# Altium footprint library mobinbyn-Capacitor.PcbLib: 152 footprints (part 4 of 10)
Each footprint in its own frame and in the unit in brackets; x right, y up, seen from the top. Pads: shape width x height; smd on the part's side, far side on the other; paste and mask are expansions set on the pad; w line width, h text height; cw(c..) or ccw(c..) is an arc to the next point about the centre after c.
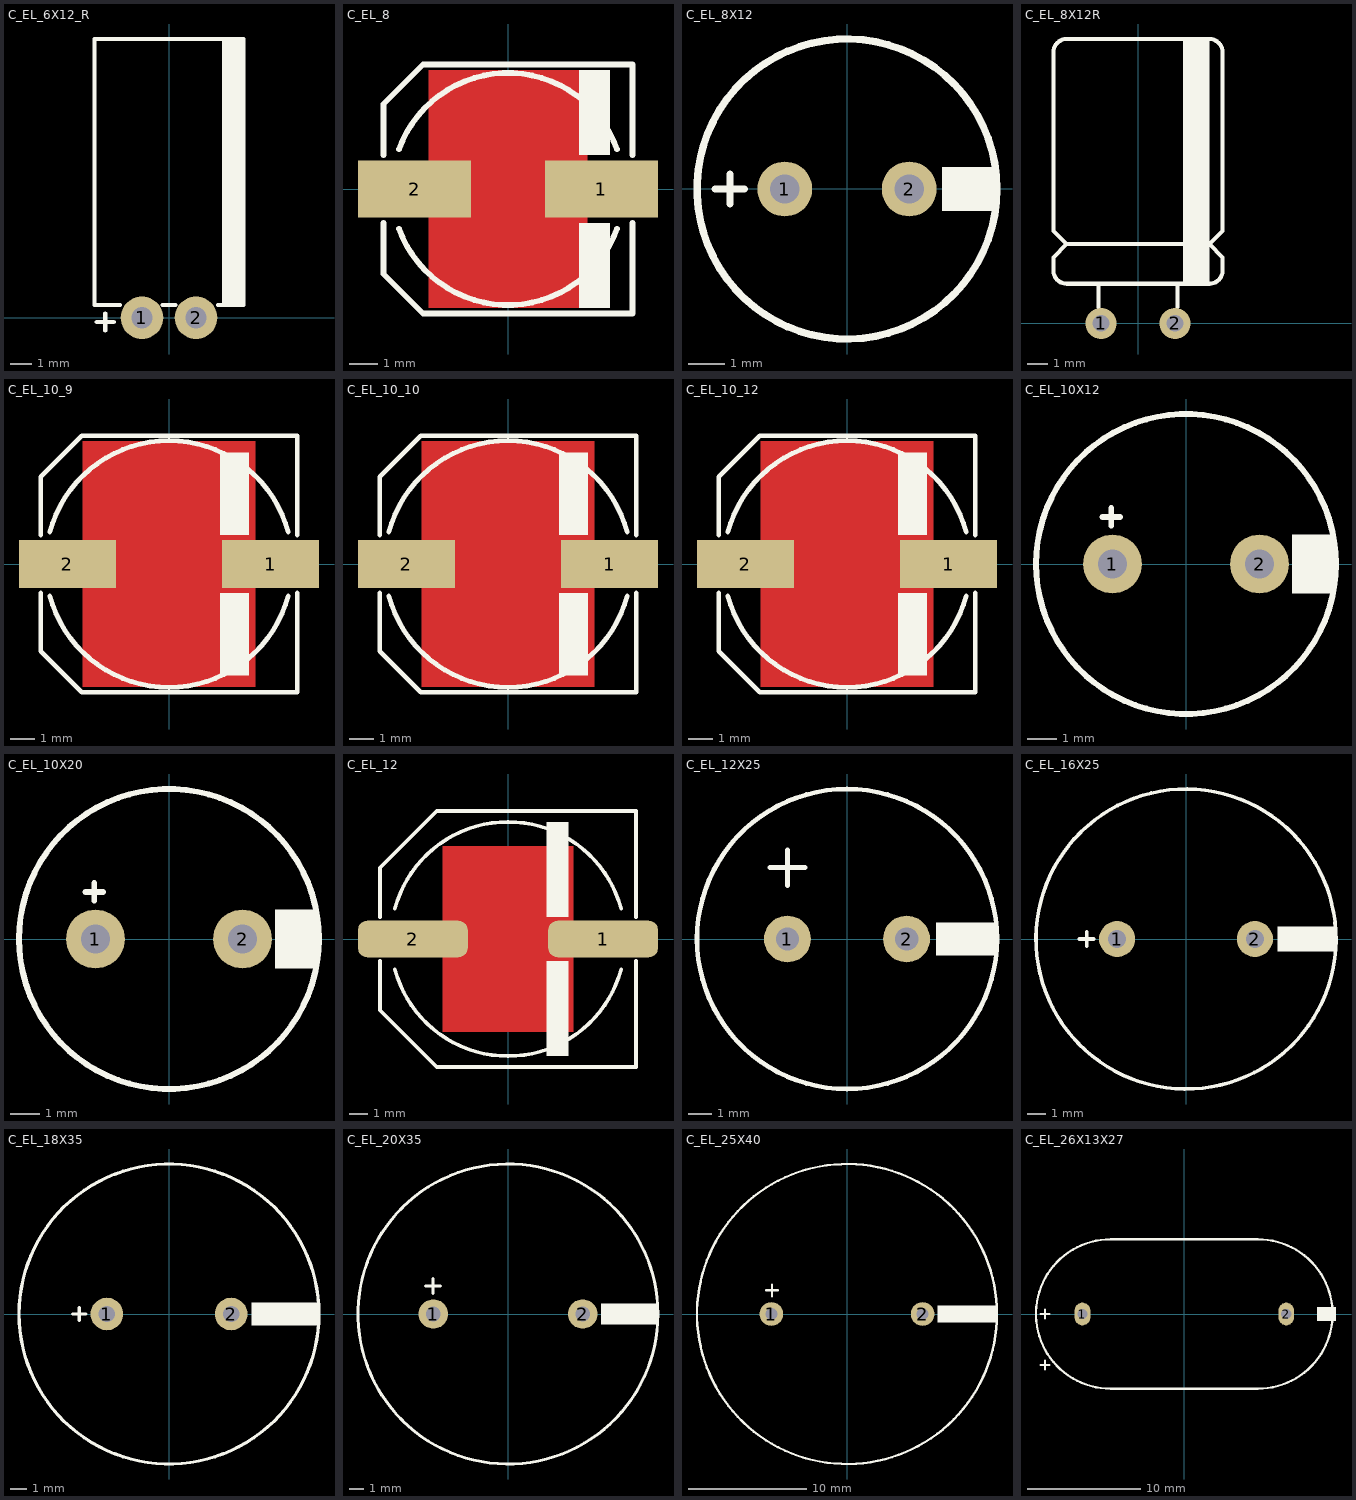
[diagram p3: the footprints below, top view; thin cyan lines are the x and y axes]

## C_EL_6X12_R [mm] "Cap Elec, D6.3X12.0H pitch: 2.5mm"
height 11
pads (2):
  round 2 hole 1: 1(-1.27,0) 2(1.27,0)
Top Overlay:
  rectangle: 2.5,0.6 3.5,13.1
  lines w0.2: -3.4,-0.2 -2.6,-0.2 ; -3,-0.6 -3,0.2 ; -2.3,0.6 -3.5,0.6 -3.5,13.1 3.5,13.1 3.5,0.6 2.3,0.6 ; -0.3,0.6 0.3,0.6
3D body "CAPAE250P680X1220_FLAT1.STEP": height 6.8, standoff -1.78, extent -3.401,-0.249 3.4,12.952

## C_EL_8 [mm] "Electrolytic Cap, Size E, Size F, 8.3X10"
height 10
pads (2):
  rect 4x2 smd: 1(3.3,0) 2(-3.3,0)
Top Layer:
  pour cut-out: 2.794,4.191 2.794,-4.191 -2.794,-4.191 -2.794,4.191
Top Overlay:
  rectangle: 2.5,1.2 3.6,4.2
  rectangle: 2.5,-4.2 3.6,-1.2
  lines w0.2: -4.4,-1.2 -4.4,-3 -3,-4.4 4.4,-4.4 4.4,-1.2 ; -4.4,1.2 -4.4,3 -3,4.4 4.4,4.4 4.4,1.2 ; -3.853,-1.402 ccw(c0,0) 3.853,-1.402 ; -3.853,1.402 cw(c0,0) 3.853,1.402
3D body "Cap_0810.STEP": height 10.3, standoff -0.2, extent -4.902,-4.25 4.798,4.25

## C_EL_8X12 [mm] "Cap Elec, D8.0X12.0H pitch: 3.5mm, RB.14/.26, RB.15/.32"
height 12
pads (2):
  round 1.5 hole 0.8: 1(-1.7,0) 2(1.7,0)
Top Overlay:
  circle w0.2: c0,0 r4.1
  rectangle: 2.6,-0.6 4,0.6
  lines w0.2: -3.6,0 -2.8,0 ; -3.2,-0.4 -3.2,0.4
3D body "User Library-Cap electro 8x11_5x3_5mm.step": height 2.98, standoff -12.53, extent -4.025,-4.025 4.025,4.025

## C_EL_8X12R [mm] "Cap Elec, D8.0X12.0H pitch: 3.5mm, RIGHT ANGLE"
pads (2):
  round 1.5 hole 0.8: 1(-1.778,0) 2(1.778,0)
Top Overlay:
  region: 2.159,13.67 2.159,1.905 3.429,1.905 3.429,13.67
  lines w0.2: -1.905,0.762 -1.905,1.905 ; 1.905,0.787 1.905,1.905 ; -3.429,3.81 3.429,3.81 ; -3.429,3.81 -4.064,3.175 -4.064,2.54 ccw(c-3.429,2.54) -3.429,1.905 3.429,1.905 ccw(c3.429,2.54) 4.064,2.54 4.064,3.175 3.429,3.81 ; -3.429,3.81 -4.064,4.445 -4.064,13.035 cw(c-3.429,13.035) -3.429,13.67 3.429,13.67 cw(c3.429,13.035) 4.064,13.035 4.064,4.445 3.429,3.81
3D body "User Library-Cap electro 8x11_5x3_5mm RA.step": height 8.03, standoff -2, extent -4.025,-0.3 4.025,13.521

## C_EL_10_9 [mm] "Electrolytic Cap, 10.3mm, L: 8.7mm"
height 8.7
pads (2):
  rect 4x2 smd: 1(4.2,0) 2(-4.2,0)
Top Layer:
  pour cut-out: -3.556,5.08 -3.556,-5.08 3.556,-5.08 3.556,5.08
Top Overlay:
  rectangle: 2.1,-4.6 3.3,-1.2
  rectangle: 2.1,1.2 3.3,4.6
  lines w0.2: -5.3,-1.2 -5.3,-3.6 -3.6,-5.3 5.3,-5.3 5.3,-1.2 ; -5.3,1.2 -5.3,3.6 -3.6,5.3 5.3,5.3 5.3,1.2 ; -4.926,-1.32 ccw(c0,0) 4.926,-1.32 ; -4.926,1.32 cw(c0,0) 4.926,1.32
3D body "10x8.7x4.5.stp": height -0.4, standoff -9.1, extent -5.5,-5.15 5.5,5.15

## C_EL_10_10 [mm] "Electrolytic Cap, 10.3mm, L: 10mm"
height 10
pads (2):
  rect 4x2 smd: 1(4.2,0) 2(-4.2,0)
Top Layer:
  pour cut-out: -3.556,5.08 -3.556,-5.08 3.556,-5.08 3.556,5.08
Top Overlay:
  rectangle: 2.1,-4.6 3.3,-1.2
  rectangle: 2.1,1.2 3.3,4.6
  lines w0.2: -5.3,-1.2 -5.3,-3.6 -3.6,-5.3 5.3,-5.3 5.3,-1.2 ; -5.3,1.2 -5.3,3.6 -3.6,5.3 5.3,5.3 5.3,1.2 ; -4.926,-1.32 ccw(c0,0) 4.926,-1.32 ; -4.926,1.32 cw(c0,0) 4.926,1.32
3D body "User Library-cap_10x10x10-1.STEP": height 10.5, standoff 0, extent -5.901,-5.25 5.899,5.25

## C_EL_10_12 [mm] "Electrolytic Cap, 10.3mm, L: 12.4mm"
height 12.4
pads (2):
  rect 4x2 smd: 1(4.2,0) 2(-4.2,0)
Top Layer:
  pour cut-out: -3.556,5.08 -3.556,-5.08 3.556,-5.08 3.556,5.08
Top Overlay:
  rectangle: 2.1,-4.6 3.3,-1.2
  rectangle: 2.1,1.2 3.3,4.6
  lines w0.2: -5.3,-1.2 -5.3,-3.6 -3.6,-5.3 5.3,-5.3 5.3,-1.2 ; -5.3,1.2 -5.3,3.6 -3.6,5.3 5.3,5.3 5.3,1.2 ; -4.926,-1.32 ccw(c0,0) 4.926,-1.32 ; -4.926,1.32 cw(c0,0) 4.926,1.32
3D body "10x12.4x4.5.stp": height 12.45, standoff 0.05, extent -5.5,-5.15 5.5,5.15

## C_EL_10X12 [mm] "Cap Elec, D10.0X12.0H pitch: 5.0mm"
height 12
pads (2):
  round 2 hole 1: 1(-2.5,0) 2(2.5,0)
Top Overlay:
  circle w0.2: c0,0 r5.1
  rectangle: 3.6,-1 5.1,1
  lines w0.2: -2.84,1.6 -2.24,1.6 ; -2.54,1.3 -2.54,1.9
3D body "ELE Radial 10x12.STEP": height 13.7, standoff -1.7, extent -5.11,-5.097 5.05,5.06

## C_EL_10X20 [mm] "Cap Elec, D10.0X20.0H pitch: 5.0mm, RB.2/.4"
height 20
pads (2):
  round 2 hole 1: 1(-2.5,0) 2(2.5,0)
Top Overlay:
  circle w0.2: c0,0 r5.1
  rectangle: 3.6,-1 5.1,1
  lines w0.2: -2.84,1.6 -2.24,1.6 ; -2.54,1.3 -2.54,1.9
3D body "CE_R200_D400_H800.step": height 20.62, standoff -2.6, extent -5.08,-5.11 5.08,5.049

## C_EL_12 [mm] "Electrolytic Cap, 12.5x13mm"
height 10
pads (2):
  rrect50% 6x2 smd mask+0.1: 1(5.2,0) 2(-5.2,0)
Top Layer:
  pour cut-out: -3.556,5.08 -3.556,-5.08 3.556,-5.08 3.556,5.08
Top Overlay:
  rectangle: 2.1,1.2 3.3,6.4
  rectangle: 2.1,-6.4 3.3,-1.2
  lines w0.2: -7,-1.2 -7,-3.9 -3.9,-7 7,-7 7,-1.2 ; -7,1.2 -7,3.9 -3.9,7 7,7 7,1.2 ; -6.182,-1.656 ccw(c0,0) 6.182,-1.656 ; -6.182,1.656 cw(c0,0) 6.182,1.656
3D body "User Library-ALU-H16.step": height 17, standoff 0, extent -7.75,-6.85 7.75,6.85

## C_EL_12X25 [mm] "Cap Elec, D12.0X25.0H pitch: 5.0mm, RB.2/.5"
pads (2):
  round 2 hole 1: 1(-2.54,0) 2(2.54,0)
Top Overlay:
  circle w0.2: c0,0 r6.4
  rectangle: 3.8,-0.7 6.4,0.7
  lines w0.2: -3.302,3.048 -1.778,3.048 ; -2.54,2.286 -2.54,3.81
3D body "User Library-Cap-EL(12_5x25-5)T.step": height 25.8, standoff -3.2, extent -6.25,-6.281 6.252,6.219

## C_EL_16X25 [mm] "Cap Elec, D16.0X25.0H pitch: 7.6mm, RB.3/.6"
pads (2):
  round 2 hole 1: 1(-3.81,0) 2(3.81,0)
Top Overlay:
  rectangle: 5.07,-0.7 8.25,0.7
  lines w0.2: -5.9,0 -5.1,0 ; -5.5,-0.4 -5.5,0.4 ; 8.148,-1.584 cw(c0,0) 8.152,-1.563
3D body "User Library-CE_R300_D650_H1000.step": height 25.4, standoff -3.5, extent -8.25,-8.25 8.25,8.25

## C_EL_18X35 [mm] "Cap Elec, D18.0X35.0H pitch: 7.6mm, RB.3/.7"
pads (2):
  round 2 hole 1: 1(-3.81,0) 2(3.81,0)
Top Overlay:
  circle w0.2: c0,0 r9.2
  rectangle: 5.07,-0.7 9.2,0.7
  lines w0.2: -5.9,0 -5.1,0 ; -5.5,-0.4 -5.5,0.4
3D body "User Library-cap-3.step": height 35.05, standoff -3.6, extent -10.426,-10.433 10.475,10.425

## C_EL_20X35 [mm] "Cap Elec, D20.0X35.0H pitch: 10.0mm, RB.4/.8"
pads (2):
  round 2 hole 1: 1(-5.08,0) 2(5.08,0)
Top Overlay:
  circle w0.2: c0,0 r10.2
  rectangle: 6.34,-0.7 10.2,0.7
  lines w0.2: -5.6,1.9 -4.6,1.9 ; -5.1,1.4 -5.1,2.4
3D body "User Library-Cap electrolitic radial 20x35.STEP": height 35.8, standoff -0.7, extent -9.996,-9.999 9.997,9.998

## C_EL_25X40 [mm] "Cap Elec, D25.0X40.0H pitch: 12.8mm, RB.5/1"
pads (2):
  round 2 hole 1: 1(-6.4,0) 2(6.4,0)
Top Overlay:
  circle w0.2: c0,0 r12.7
  rectangle: 7.66,-0.7 12.7,0.7
  lines w0.2: -6.85,2 -5.85,2 ; -6.35,1.5 -6.35,2.5
3D body "User Library-CE_R530_D1000_H1750.step": height 42.2, standoff -2.5, extent -12.7,-12.7 12.7,12.7

## C_EL_26X13X27 [mm] "Cap Elec, 26X13X27mm, 18mm pitch"
height 27
pads (2):
  oval 1.4x2 hole 0.9: 1(-9,0) 2(9,0)
Top Overlay:
  rectangle: 11.7,-0.6 13.4,0.6
  lines w0.2: -12.7,-4.5 -11.9,-4.5 ; -12.7,0 -11.9,0 ; -12.3,-4.9 -12.3,-4.1 ; -12.3,-0.4 -12.3,0.4 ; -6.5,-6.6 cw(c-6.5,0) -6.5,6.6 6.5,6.6 cw(c6.5,0) 6.5,-6.6 -6.5,-6.6
3D body: height 3, standoff -2, extent 8.7,-0.299 9.298,0.3
3D body: height 27, standoff 0, extent -13,-6.5 0,6.5
3D body: height 27, standoff 0, extent 0,-6.5 13,6.5
3D body: height 27, standoff 0, extent -7,-6.5 7,6.5
3D body: height 3, standoff -2, extent -9.297,-0.299 -8.7,0.299